# Altium footprint library TranDangKhoa-LIB.PcbLib: 1435 footprints (part 45 of 90)
Each footprint in its own frame and in the unit in brackets; x right, y up, seen from the top. Pads: shape width x height; smd on the part's side, far side on the other; paste and mask are expansions set on the pad; w line width, h text height; cw(c..) or ccw(c..) is an arc to the next point about the centre after c.
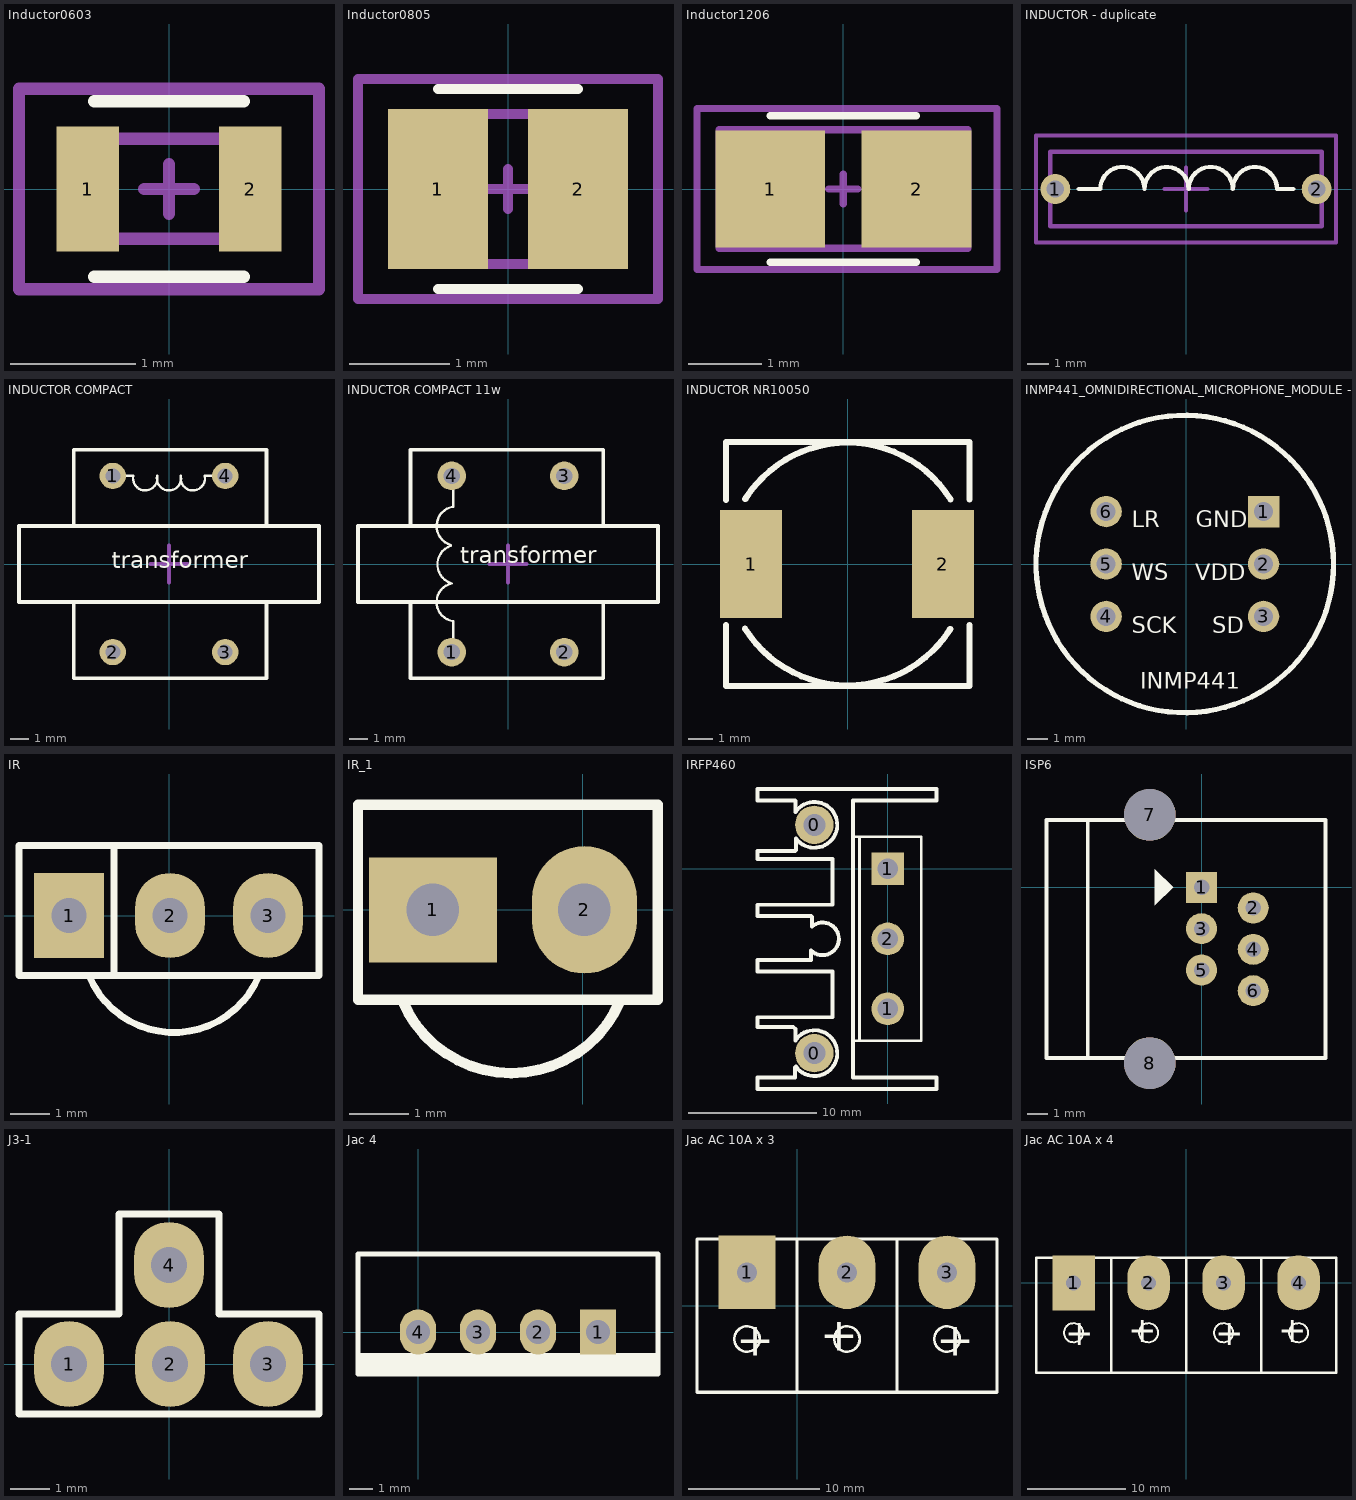
[diagram p44: the footprints below, top view; thin cyan lines are the x and y axes]

## Inductor0603 [mm]
pads (2):
  rect 0.5x1 smd mask+0.01: 1(-0.65,0) 2(0.65,0)
Top Overlay:
  lines w0.1: -0.6,-0.7 0.6,-0.7 ; -0.6,0.7 0.6,0.7
Mechanical 13:
  lines w0.1: -0.8,-0.4 0.8,-0.4 0.8,0.4 -0.8,0.4 -0.8,-0.4
Mechanical 15:
  lines w0.1: -0.2,0 0.2,0 ; 0,-0.2 0,0.2 ; -1.2,-0.8 -1.2,0.8 1.2,0.8 1.2,-0.8 -1.2,-0.8
3D body "Ind0603.STEP": height 0.8, standoff 0, extent -0.8,-0.4 0.8,0.4

## Inductor0805 [mm]
pads (2):
  rect 1x1.6 smd mask+0.01: 1(-0.7,0) 2(0.7,0)
Top Overlay:
  lines w0.1: -0.7,-1 0.7,-1 ; -0.7,1 0.7,1
Mechanical 13:
  lines w0.1: -1.05,-0.75 1.05,-0.75 1.05,0.75 -1.05,0.75 -1.05,-0.75
Mechanical 15:
  lines w0.1: -0.2,0 0.2,0 ; 0,-0.2 0,0.2 ; -1.5,-1.1 -1.5,1.1 1.5,1.1 1.5,-1.1 -1.5,-1.1
3D body "Ind0805.STEP": height 1.83, standoff -0.02, extent -1.05,-0.75 1.05,0.75

## Inductor1206 [mm]
pads (2):
  rect 1.5x1.6 smd mask+0.01: 1(-1,0) 2(1,0)
Top Overlay:
  lines w0.1: -1,-1 1,-1 ; -1,1 1,1
Mechanical 13:
  lines w0.1: -1.7,-0.808 -1.7,0.808 1.7,0.808 1.7,-0.808 -1.7,-0.808
Mechanical 15:
  lines w0.1: -0.2,0 0.2,0 ; 0,-0.2 0,0.2 ; -2,-1.1 2.1,-1.1 2.1,1.1 -2,1.1 -2,-1.1
3D body "Ind1206.STEP": height 1.79, standoff -0.01, extent -1.7,-0.808 1.7,0.808

## INDUCTOR - duplicate [mm]
pads (2):
  round 1.4 hole 0.8 unplated mask+0.01: 1(-6.1,0) 2(6.1,0)
Top Overlay:
  lines w0.2: -5,0 -4,0 cw(c-2.969,0) -1.938,0 cw(c-0.908,0) 0.123,0 cw(c1.154,0) 2.185,0 cw(c3.215,0) 4.246,0 5,0
Mechanical 13:
  lines w0.2: -6.336,-1.738 6.336,-1.738 6.336,1.739 -6.336,1.739 -6.336,-1.738
Mechanical 15:
  lines w0.2: -1,0 1,0 ; 0,-1 0,1 ; -7,-2.5 -7,2.5 7,2.5 7,-2.5 -7,-2.5
3D body "EC24-1R0K.STEP": height 4.71, standoff -2, extent -6.336,-1.738 6.336,1.739

## INDUCTOR COMPACT [mm]
pads (4):
  round 1.4 hole 0.8 unplated mask+0.01: 1(-3,4.7) 2(-3,-4.7) 3(3,-4.7) 4(3,4.7)
Top Overlay:
  lines w0.127: -3.048,4.699 -1.905,4.699 ccw(c-1.27,4.572) -0.629,4.664 ; -0.635,4.699 ccw(c0,4.572) 0.641,4.664 ; 0.635,4.699 ccw(c1.27,4.572) 1.911,4.664 ; 1.905,4.699 2.794,4.699
  lines w0.2: -5.08,-2.032 -5.08,-6.096 5.207,-6.096 5.207,-2.032 ; -5.08,2.032 -5.08,6.096 5.207,6.096 5.207,2.032 ; -8.001,-2.032 8.001,-2.032 8.001,2.032 -8.001,2.032 -8.001,-2.032
  text "transformer" at -3.048,-0.508 h1.52
Mechanical 15:
  lines w0.2: -1,0 1,0 ; 0,-1 0,1
3D body "cuon cam.STEP": height 15.5, standoff -2.45, extent -8,-5.968 8,6.032

## INDUCTOR COMPACT 11w [mil]
pads (4):
  round 60 hole 34: 1(-118.11,-185.04) 4(-118.11,185.04)
  round 60 hole 34 unplated: 2(118.11,-185.04) 3(118.11,185.04)
Top Overlay:
  lines w5: -120,-40 cw(c-106.96,-0.88) -120,38.23 ; -120,40 cw(c-108.67,79.64) -115.06,120.38 ; -118.04,-40.88 ccw(c-109.86,-80.19) -115,-120 -115,-185 ; -115,120 -115,175
  lines w7.87: -205,-85 -205,-240 200,-240 200,-80 ; -205,80 -205,240 200,240 200,80 ; -315,-80 315,-80 315,80 -315,80 -315,-80
  text "transformer" at -100,-10 h60
Mechanical 15:
  lines w7.87: -39.37,0 39.37,0 ; 0,-39.37 0,39.37
3D body "cuon cam.STEP": height 610.24, standoff -96.46, extent -314.96,-235 314.96,237.44

## INDUCTOR NR10050 [mm] "NR10050T100M"
height 5
pads (2):
  rect 2.6x4.5 smd: 1(-4.032,0) 2(3.968,0)
Top Overlay:
  lines w0.254: -5.08,-2.54 -5.08,-5.08 5.08,-5.08 5.08,-2.54 ; -5.08,2.667 -5.08,5.08 -4.445,5.08 5.08,5.08 5.08,2.698 ; -4.279,-2.698 ccw(c0,0) 4.271,-2.711 ; -4.271,2.711 cw(c0,0) 4.279,2.698
3D body "SUMIDA-CDHR10D68R_T125 10x10mm.step": height 6.95, standoff 0.05, extent -5.197,-5.014 5.103,4.986

## INMP441_OMNIDIRECTIONAL_MICROPHONE_MODULE - duplicate [mil]
pads (6):
  rect 60x60 hole 36 paste-99999 mask+2: 1(147.68,100)
  round 60 hole 36 paste-99999 mask+2: 2(147.68,0) 3(147.68,-100) 4(-152.32,-100) 5(-152.32,0) 6(-152.32,100)
Top Overlay:
  circle w10: c-2.33,0 r283.47
  text "GND" at 18.89,69.92 h31.5
  text "VDD" at 17.43,-30.87 h31.5
  text "SD" at 49.77,-131.66 h31.5
  text "SCK" at -103.53,-131.66 h31.5
  text "WS" at -103.5,-30.86 h31.5
  text "LR" at -103.47,69.92 h31.5
  text "INMP441" at -87.2,-237.48 h31.5
Bottom Overlay:
  circle w10: c2.33,0 r283.47
  text "GND" at 98.06,69.92 h31.5
  text "VDD" at 98.12,-30.87 h31.5
  text "SD" at 98.09,-131.66 h31.5
  text "SCK" at -24.39,-131.66 h31.5
  text "WS" at -46.7,-30.86 h31.5
  text "LR" at -58.16,69.92 h31.5
  text "INMP441" at 82.95,-237.48 h31.5

## IR [mil] "Receiver Infared IC"
height 200
pads (3):
  rect 70x85 hole 35: 1(-100,0)
  oval 70x85 hole 35: 2(1,0) 3(99,0)
Top Overlay:
  lines w7: -80,-60 ccw(c5,-25) 90,-60 ; -55,-60 -55,70 ; -150,-60 -150,70 150,70 150,-60 -150,-60

## IR_1 [mil] "Receiver Infared IC"
height 200
pads (2):
  rect 85x70 hole 35: 1(-100,0)
  oval 70x85 hole 35: 2(1,0)
Top Overlay:
  lines w7: -120.62,-60 ccw(c-47.81,-30.02) 25,-60 ; -150,-60 -150,70 50,70 50,-60 -150,-60
3D body "User Library-QSE113.STEP": height 493.7, standoff -206.3, extent -134.8,-91.32 40,31.32

## IRFP460 [mm]
pads (5):
  round 3 hole 1.7: 0(-5.715,-14.351) 0(-5.715,3.429)
  round 2.54 hole 1.6: 1(0,-10.9) 2(0,-5.45)
  rect 2.54x2.54 hole 1.6: 1(0,0)
Top Overlay:
  lines w0.2: -2.2,-13.4 -2.2,2.5 ; -2.7,-13.4 2.6,-13.4 2.6,2.5 -2.7,2.5 -2.7,-13.4
  lines w0.305: -2.7,2.159 -2.7,5.334 3.81,5.334 3.81,6.223 -10.16,6.223 -10.16,5.334 -7.239,5.334 -7.198,5.293 -7.198,4.418 cw(c-5.715,3.429) -7.157,2.381 -7.157,1.479 -7.239,1.397 -8.382,1.397 -10.16,1.397 -10.16,0.762 -4.318,0.762 -4.318,-2.794 -10.16,-2.794 -10.16,-3.683 -5.969,-3.683 -5.9,-3.752 -5.9,-4.48 cw(c-5.08,-5.45) -5.972,-6.354 -5.972,-7.109 -5.969,-7.112 -10.16,-7.112 -10.16,-8.001 -4.318,-8.001 -4.318,-11.557 -10.16,-11.557 -10.16,-12.319 -7.366,-12.319 -7.198,-12.487 -7.198,-13.362 cw(c-5.715,-14.351) -7.157,-15.399 -7.239,-15.482 -7.239,-16.256 -10.16,-16.256 -10.16,-17.145 3.81,-17.145 3.81,-16.256 -2.7,-16.256 -2.7,3.048

## ISP6 [mil] "Jac nap PIC"
pads (8):
  rect 60x60 hole 30: 1(0,0)
  round 60 hole 30: 2(100,-40) 3(0,-80) 4(100,-120) 5(0,-160) 6(100,-200)
  round 100 hole 100: 7(-100,140) 8(-100,-340)
Top Overlay:
  region: -55,0 -90,35 -90,-35
  lines w7: -220,-330 -220,130
  lines w8: -300,-330 240,-330 240,130 -300,130 -300,-330

## J3-1 [mil] "Jumper 4"
height 200
pads (4):
  oval 70x86 hole 36: 1(-100,0) 2(1,0) 3(99,0) 4(0,99)
Top Overlay:
  lines w7: -150,-50 150,-50 150,50 50,50 50,150 -50,150 -50,50 -150,50 -150,-50

## Jac 4 [mil] "Jac connect 4pin"
pads (4):
  rect 60x75 hole 40: 1(300,0)
  oval 60x75 hole 40: 2(200,0) 3(100,0) 4(0,0)
Top Overlay:
  rectangle: -100,-70 400,-35
  lines w7.87: -100,-70 -100,130 400,130 400,-70 -100,-70

## Jac AC 10A x 3 [mil] "Jac nguon 220V 10A"
pads (3):
  rect 170x220 hole 60: 1(-150,100)
  oval 170x220 hole 60: 2(150,100) 3(450,100)
Top Overlay:
  circle w8: c450,-100 r38.08
  circle w8: c150,-100 r38.08
  circle w8: c-150,-100 r38.08
  lines w10: 0,-260 0,200 ; 300,-260 600,-260 600,200 300,200 ; 300,-260 300,200 ; 300,-260 -300,-260 -300,200 300,200 ; 300,-260 300,-200 ; 300,-200 300,200 ; 300,-200 300,200
  text "+" at 417,-150 h100
  text "+" at 183,-50 h100
  text "+" at -183,-150 h100

## Jac AC 10A x 4 [mil] "Jac nguon 220V 10A"
pads (4):
  rect 170x220 hole 60: 1(-450,0)
  oval 170x220 hole 60: 2(-150,0) 3(150,0) 4(450,0)
Top Overlay:
  circle w8: c-450,-200 r38.08
  circle w8: c-150,-200 r38.08
  circle w8: c150,-200 r38.08
  circle w8: c450,-200 r38.08
  lines w10: -300,-360 -300,100 ; 300,-360 300,100 ; 0,-360 0,-300 ; 0,-360 -600,-360 -600,100 0,100 ; 0,-360 0,100 ; 0,-360 600,-360 600,-300 ; 0,-300 0,100 ; 0,-300 0,100 ; 0,100 600,100 ; 600,-300 600,100 ; 600,-300 600,100
  text "+" at -483,-250 h100
  text "+" at -117,-150 h100
  text "+" at 117,-250 h100
  text "+" at 483,-150 h100